# Altium footprint library Wurth_Elektronik_Electromechanic_Wire_to_Board_Connectors_rev16a.PCBLIB: 662 footprints (part 15 of 42)
Each footprint in its own frame and in the unit in brackets; x right, y up, seen from the top. Pads: shape width x height; smd on the part's side, far side on the other; paste and mask are expansions set on the pad; w line width, h text height; cw(c..) or ccw(c..) is an arc to the next point about the centre after c.
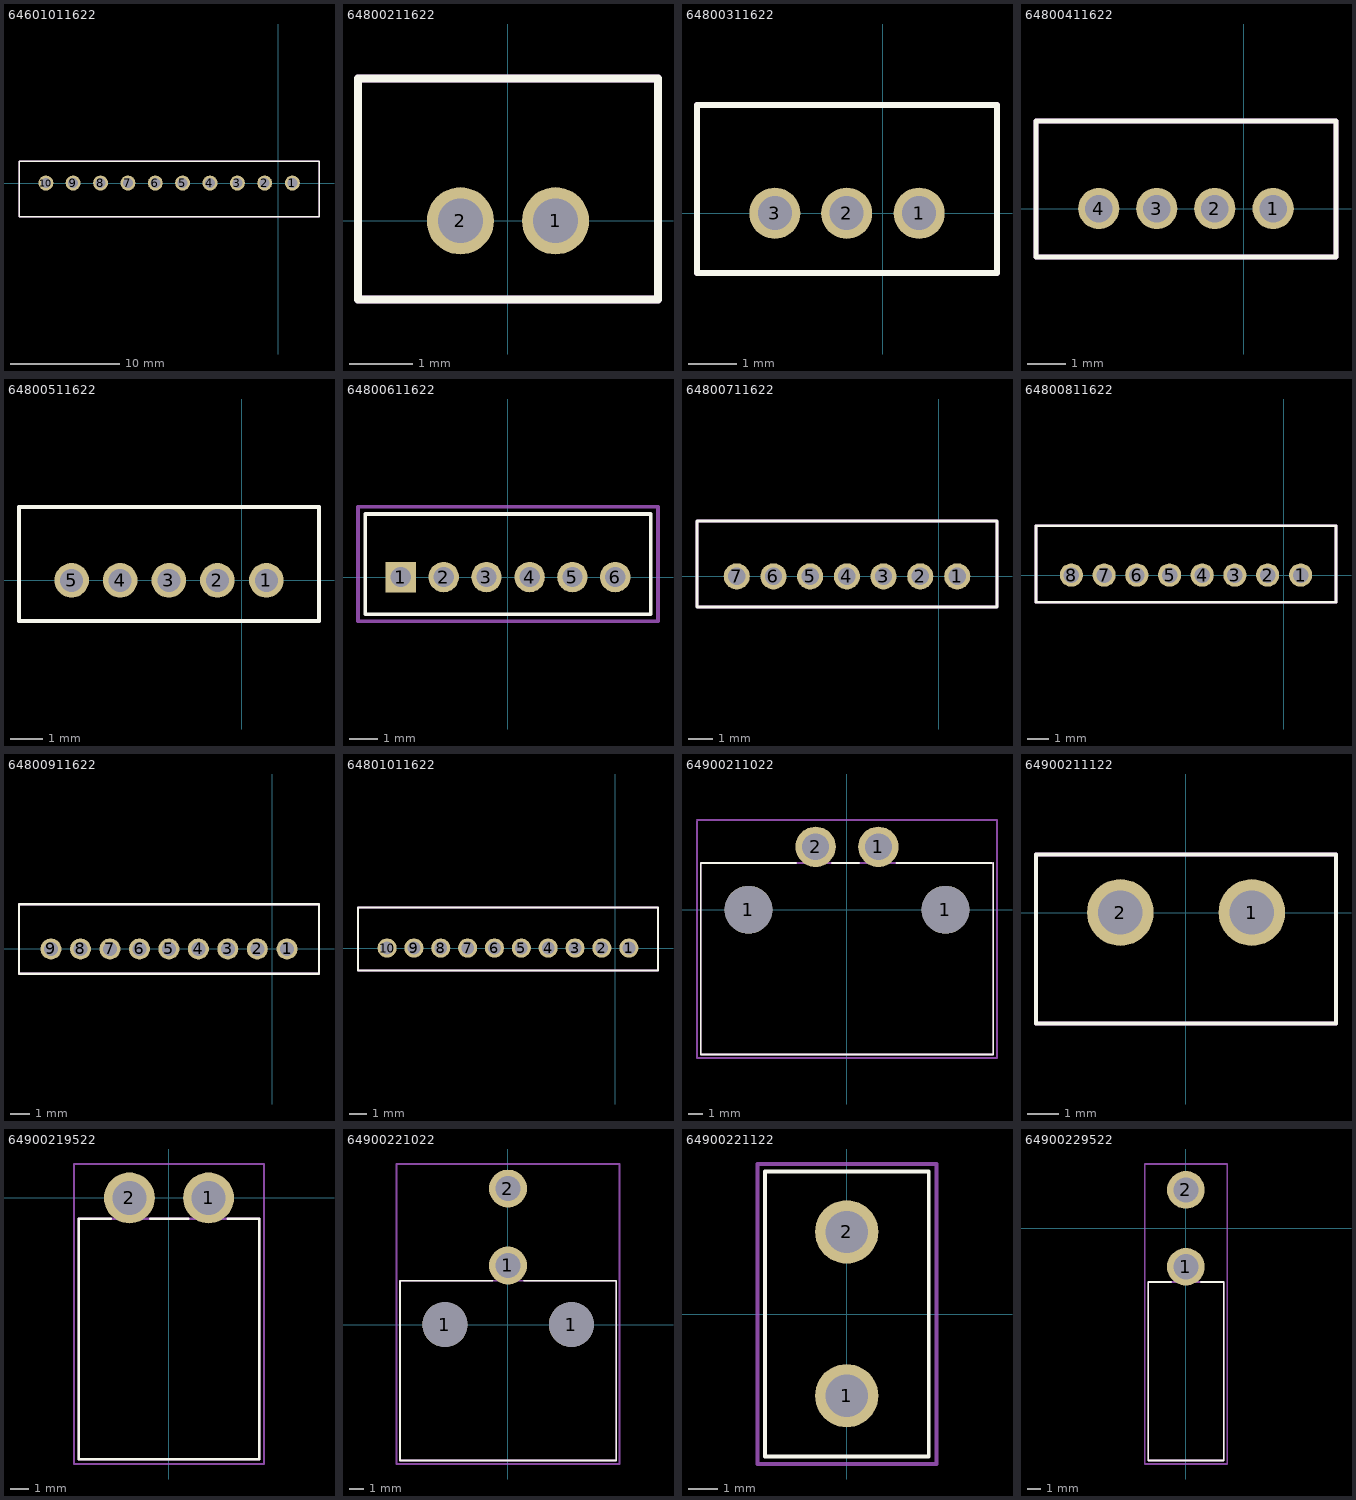
[diagram p14: the footprints below, top view; thin cyan lines are the x and y axes]

## 64601011622 [mil]
pads (10):
  round 54 hole 36: 1(50,0) 2(-49.21,0) 3(-147.64,0) 4(-246.06,0) 5(-344.49,0) 6(-442.91,0) 7(-541.34,0) 8(-639.76,0) 9(-738.19,0) 10(-836.61,0)
Top Overlay:
  lines w5: -933.07,-122.05 146,-122.05 146,79 -933.07,79 -933.07,-122.05
Mechanical 2:
  text ">NAME" at 176,0 h77.5
Mechanical 4:
  text ">VALUE" at 185,-77.95 h77.5
Mechanical 16:
  lines w5: -933.07,-122.05 146,-122.05 146,79 -933.07,79 -933.07,-122.05
  text "1" at 25,-24.61 h77.5
  text "10" at -861.22,-24.61 h77.5

## 64800211622 [mil]
pads (2):
  round 42 hole 28: 1(30,0) 2(-29.53,0)
Top Overlay:
  lines w5: -93.5,-49.21 -93.5,89 94,89 94,-49.21 -93.5,-49.21
Mechanical 2:
  text ">NAME" at 148,30 h77.5
Mechanical 4:
  text ">VALUE" at 148,-29.53 h77.5
Mechanical 16:
  lines w5: -93.5,-49.21 94,-49.21 94,89 -93.5,89 -93.5,-49.21
  text "1" at 15,-29.53 h77.5
  text "2" at -59.06,-29.53 h77.5

## 64800311622 [mil]
pads (3):
  round 42 hole 28: 1(30,0) 2(-29.53,0) 3(-88.58,0)
Top Overlay:
  lines w5: -152.56,-49.21 -152.56,89 94,89 94,-49.21 -152.56,-49.21
Mechanical 2:
  text ">NAME" at 148,30 h77.5
Mechanical 4:
  text ">VALUE" at 148,-29.53 h77.5
Mechanical 16:
  lines w5: -152.56,-49.21 94,-49.21 94,89 -152.56,89 -152.56,-49.21
  text "1" at 15,-29.53 h77.5
  text "3" at -103.35,-29.53 h77.5

## 64800411622 [mil]
pads (4):
  round 42 hole 28: 1(30,0) 2(-29.53,0) 3(-88.58,0) 4(-147.64,0)
Top Overlay:
  lines w5: -211.61,-49.21 -211.61,89 94,89 94,-49.21 -211.61,-49.21
Mechanical 2:
  text ">NAME" at 148,30 h77.5
Mechanical 4:
  text ">VALUE" at 148,-29.53 h77.5
Mechanical 16:
  lines w5: -211.61,-49.21 94,-49.21 94,89 -211.61,89 -211.61,-49.21
  text "1" at 15,-29.53 h77.5
  text "4" at -177.17,-29.53 h77.5

## 64800511622 [mil]
pads (5):
  round 42 hole 28: 1(30,0) 2(-29.53,0) 3(-88.58,0) 4(-147.64,0) 5(-206.69,0)
Top Overlay:
  lines w5: -270.67,-49.21 -270.67,89 94,89 94,-49.21 -270.67,-49.21
Mechanical 2:
  text ">NAME" at 148,30 h77.5
Mechanical 4:
  text ">VALUE" at 148,-29.53 h77.5
Mechanical 16:
  lines w5: -270.67,-49.21 94,-49.21 94,89 -270.67,89 -270.67,-49.21
  text "1" at 15,-29.53 h77.5
  text "5" at -221.46,-29.53 h77.5

## 64800611622 [mil]
pads (6):
  rect 42x42 hole 28: 1(-147.64,0)
  round 42 hole 28: 2(-88.58,0) 3(-29.53,0) 4(30,0) 5(89,0) 6(148,0)
Top Overlay:
  lines w5: -196.85,-51.18 -196.85,87 197,87 197,-51.18 -196.85,-51.18
Mechanical 2:
  text ">NAME" at -196.85,107 h77.5
Mechanical 4:
  text ">VALUE" at -196.85,-121.18 h77.5
Mechanical 27:
  lines w5: -206.69,-61.02 -206.69,97 207,97 207,-61.02 -206.69,-61.02

## 64800711622 [mil]
pads (7):
  round 42 hole 28: 1(30,0) 2(-29.53,0) 3(-88.58,0) 4(-147.64,0) 5(-206.69,0) 6(-265.75,0) 7(-324.8,0)
Top Overlay:
  lines w5: -388.78,-49.21 -388.78,89 94,89 94,-49.21 -388.78,-49.21
Mechanical 2:
  text ">NAME" at 148,30 h77.5
Mechanical 4:
  text ">VALUE" at 148,-29.53 h77.5
Mechanical 16:
  lines w5: -388.78,-49.21 94,-49.21 94,89 -388.78,89 -388.78,-49.21
  text "1" at 15,-29.53 h77.5
  text "7" at -339.57,-29.53 h77.5

## 64800811622 [mil]
pads (8):
  round 42 hole 28: 1(30,0) 2(-29.53,0) 3(-88.58,0) 4(-147.64,0) 5(-206.69,0) 6(-265.75,0) 7(-324.8,0) 8(-383.86,0)
Top Overlay:
  lines w5: -447.83,-49.21 -447.83,89 94,89 94,-49.21 -447.83,-49.21
Mechanical 2:
  text ">NAME" at 148,30 h77.5
Mechanical 4:
  text ">VALUE" at 148,-29.53 h77.5
Mechanical 16:
  lines w5: -447.83,-49.21 94,-49.21 94,89 -447.83,89 -447.83,-49.21
  text "1" at 15,-29.53 h77.5
  text "8" at -398.62,-29.53 h77.5

## 64800911622 [mil]
pads (9):
  round 42 hole 28: 1(30,0) 2(-29.53,0) 3(-88.58,0) 4(-147.64,0) 5(-206.69,0) 6(-265.75,0) 7(-324.8,0) 8(-383.86,0) 9(-442.91,0)
Top Overlay:
  lines w5: -506.89,-49.21 -506.89,89 94,89 94,-49.21 -506.89,-49.21
Mechanical 2:
  text ">NAME" at 148,30 h77.5
Mechanical 4:
  text ">VALUE" at 148,-29.53 h77.5
Mechanical 16:
  lines w5: -506.89,-49.21 94,-49.21 94,89 -506.89,89 -506.89,-49.21
  text "1" at 15,-29.53 h77.5
  text "9" at -457.68,-29.53 h77.5

## 64801011622 [mil]
pads (10):
  round 42 hole 28: 1(30,0) 2(-29.53,0) 3(-88.58,0) 4(-147.64,0) 5(-206.69,0) 6(-265.75,0) 7(-324.8,0) 8(-383.86,0) 9(-442.91,0) 10(-501.97,0)
Top Overlay:
  lines w5: -565.94,-49.21 -565.94,89 94,89 94,-49.21 -565.94,-49.21
Mechanical 2:
  text ">NAME" at 148,30 h77.5
Mechanical 4:
  text ">VALUE" at 148,-29.53 h77.5
Mechanical 16:
  lines w5: -565.94,-49.21 94,-49.21 94,89 -565.94,89 -565.94,-49.21
  text "1" at 15,-29.53 h77.5
  text "10" at -546.26,-29.53 h77.5

## 64900211022 [mil]
pads (4):
  round 126 hole 126: 1(-259.84,0) 1(260,0)
  round 106.5 hole 71: 1(83,166) 2(-82.68,166)
Top Overlay:
  lines w5: -133.86,123 -385.83,123 -385.83,-381.89 386,-381.89 386,123 ; -39.37,123 32,123 ; 130,123 382,123
Mechanical 2:
  text ">NAME" at -109.25,264 h77.5
Mechanical 4:
  text ">VALUE" at -142.13,-457.09 h77.5
Mechanical 16:
  lines w5: -385.83,-381.89 -385.83,123 386,123 386,-381.89 -385.83,-381.89
  text "1" at 75,141 h77.5
  text "2" at -100,141 h77.5
Mechanical 27:
  lines w5: -395.67,233 -395.67,-391.73 396,-391.73 396,237 -395.67,237

## 64900211122 [mil]
pads (2):
  round 84 hole 56: 1(83,0) 2(-82.68,0)
Top Overlay:
  lines w5: -188.98,-139.76 189,-139.76 189,73 -188.98,73 -188.98,-139.76
Mechanical 2:
  text ">NAME" at -125,125 h77.5
Mechanical 4:
  text ">VALUE" at -146.06,-237.99 h77.5
Mechanical 16:
  lines w5: -188.98,-139.76 189,-139.76 189,73 -188.98,73 -188.98,-139.76
  text "1" at 75,-25 h77.5
  text "2" at -100,-25 h77.5

## 64900219522 [mil]
pads (2):
  round 106.5 hole 71: 1(83,0) 2(-82.68,0)
Top Overlay:
  lines w5: -122.05,-43.31 -188.98,-43.31 -188.98,-547.24 189,-547.24 189,-43.31 123,-43.31 ; -39.37,-43.31 40,-43.31
Mechanical 2:
  text ">NAME" at -125,103 h77.5
Mechanical 4:
  text ">VALUE" at -150,-650 h77.5
Mechanical 16:
  lines w5: -188.98,-547.24 -188.98,-43.31 189,-43.31 189,-547.24 -188.98,-547.24
  text "1" at 75,-25 h77.5
  text "2" at -100,-25 h77.5
Mechanical 27:
  lines w5: -198.82,-557.09 199,-557.09 199,71 -198.82,71 -198.82,-557.09

## 64900221022 [mil]
pads (4):
  round 126 hole 126: 1(-177.17,0) 1(178,0)
  round 106.5 hole 71: 1(0,166) 2(0,382)
Top Overlay:
  lines w5: -43.31,123 -303.15,123 -303.15,-381.89 304,-381.89 304,123 44,123
Mechanical 2:
  text ">NAME" at -650,-126.38 h77.5
Mechanical 4:
  text ">VALUE" at -650,-226.38 h77.5
Mechanical 16:
  lines w5: -303.15,-381.89 304,-381.89 304,123 -303.15,123 -303.15,-381.89
  text "1" at 75,174 h77.5
Mechanical 27:
  lines w5: -312.99,-391.73 313,-391.73 313,451 -312.99,451 -312.99,-391.73

## 64900221122 [mil]
pads (2):
  round 84 hole 56: 1(0,-108.27) 2(0,109)
Top Overlay:
  lines w5: -108.27,-188.98 109,-188.98 109,189 -108.27,189 -108.27,-188.98
Mechanical 2:
  text ">NAME" at -108.27,237 h77.5
Mechanical 4:
  text ">VALUE" at -127.95,-285.43 h77.5
Mechanical 16:
  text "1" at -25,-125 h77.5
  text "2" at -25,75 h77.5
Mechanical 27:
  lines w5: -118.11,-198.82 119,-198.82 119,199 -118.11,199 -118.11,-198.82

## 64900229522 [mil]
pads (2):
  round 106.5 hole 71: 1(0,-108.27) 2(0,109)
Top Overlay:
  lines w5: -41.34,-151.57 -106.3,-151.57 -106.3,-655.51 107,-655.51 107,-151.57 42,-151.57
Mechanical 2:
  text ">NAME" at -436.71,-333.86 h77.5
Mechanical 4:
  text ">VALUE" at -436.71,-438.29 h77.5
Mechanical 16:
  lines w5: -106.3,-655.51 107,-655.51 107,-151.57 -106.3,-151.57 -106.3,-655.51
  text "1" at -1.38,-133.86 h77.5
Mechanical 27:
  lines w5: -116.14,-665.35 117,-665.35 117,182 -116.14,182 -116.14,-665.35